# Altium footprint library Miscellaneous Devices LC.PcbLib: 776 footprints (part 5 of 49)
Each footprint in its own frame and in the unit in brackets; x right, y up, seen from the top. Pads: shape width x height; smd on the part's side, far side on the other; paste and mask are expansions set on the pad; w line width, h text height; cw(c..) or ccw(c..) is an arc to the next point about the centre after c.
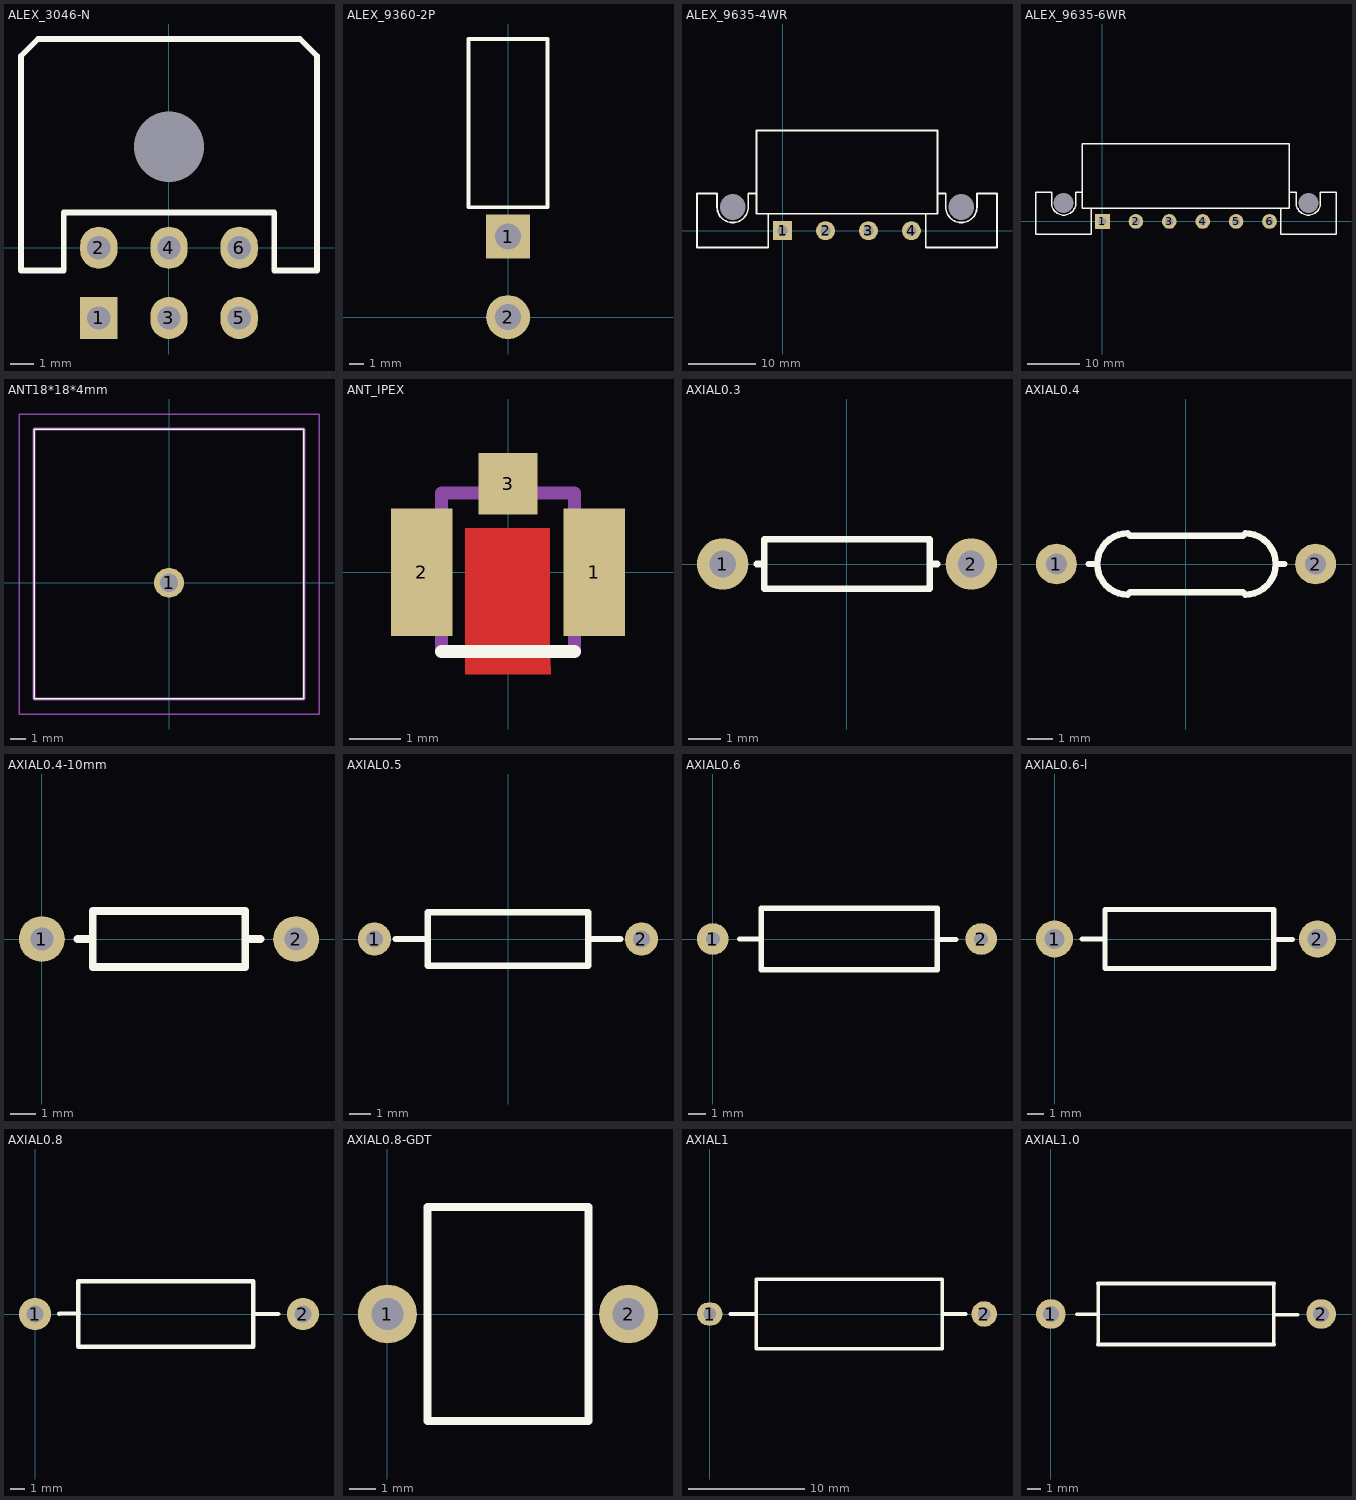
[diagram p4: the footprints below, top view; thin cyan lines are the x and y axes]

## ALEX_3046-N [mm] "配套3025-N"
pads (7):
  rect 1.6x1.8 hole 1: 1(-3,-3)
  oval 1.6x1.8 hole 1: 2(-3,0) 3(0,-3) 4(0,0) 5(3,-3) 6(3,0)
  round 0 hole 3 unplated: N/A(0,4.32)
Top Overlay:
  lines w0.254: -6.325,-0.975 -6.325,8.2 -5.6,8.925 5.6,8.925 6.325,8.2 6.325,-0.975 4.5,-0.975 4.5,1.5 -4.5,1.5 -4.5,-0.975 -6.325,-0.975

## ALEX_9360-2P [mm] "Mini Fit直角接头/ .165“（4.20mm）电源连接器"
pads (2):
  rect 3x3 hole 1.8: 1(0,5.5)
  round 3 hole 1.8: 2(0,0)
Top Overlay:
  lines w0.254: -2.704,7.5 -2.704,19 2.696,19 2.696,7.5 -2.704,7.5

## ALEX_9635-4WR [mm] "亚达康电源连接器"
height 9
pads (6):
  rect 2.8x2.8 hole 1.52: 1(0,0)
  round 2.8 hole 1.52: 2(6.35,0) 3(12.7,0) 4(19.05,0)
  round 0 hole 3.81 unplated: N/A(-7.37,3.5) N/A(26.42,3.5)
Top Overlay:
  lines w0.254: -3.835,5.5 -5.07,5.5 -5.07,3.5 cw(c-7.37,3.5) -9.67,3.5 -9.67,5.5 -12.64,5.5 -12.64,-2.47 -2.1,-2.47 -2.1,2.5 ; 21.15,2.5 21.15,-2.47 31.69,-2.47 31.69,5.5 28.72,5.5 28.72,3.5 cw(c26.42,3.5) 24.12,3.5 24.12,5.5 22.885,5.5 ; -3.835,2.5 -3.835,14.8 22.885,14.8 22.885,2.5 -3.835,2.5
3D body: height 8, standoff 0, extent -3.861,2.565 22.835,14.808

## ALEX_9635-6WR [mm] "亚达康电源连接器"
height 9
pads (8):
  rect 2.8x2.8 hole 1.52: 1(0,0)
  round 2.8 hole 1.52: 2(6.35,0) 3(12.7,0) 4(19.05,0) 5(25.4,0) 6(31.75,0)
  round 0 hole 3.81 unplated: N/A(-7.37,3.5) N/A(39.12,3.5)
Top Overlay:
  lines w0.254: -3.835,5.5 -5.07,5.5 -5.07,3.5 cw(c-7.37,3.5) -9.67,3.5 -9.67,5.5 -12.64,5.5 -12.64,-2.47 -2.1,-2.47 -2.1,2.5 ; 33.85,2.5 33.85,-2.47 44.39,-2.47 44.39,5.5 41.42,5.5 41.42,3.5 cw(c39.12,3.5) 36.82,3.5 36.82,5.5 35.585,5.5 ; -3.835,2.5 35.55,2.5 35.55,14.8 -3.835,14.8 -3.835,2.5
3D body: height 8, standoff 0, extent -3.861,2.565 35.475,14.808

## ANT18*18*4mm [mm] "GPS天线18*18*4mm"
height 4
pads (1):
  round 2 hole 1.2: 1(0,0)
Top Overlay:
  lines w0.1: -9,-7.75 9,-7.75 9,10.25 -9,10.25 -9,-7.75
Mechanical 15:
  lines w0.2: -9,-7.75 9,-7.75 9,10.25 -9,10.25 -9,-7.75
Mechanical 20:
  lines w0.1: -10,-8.75 10,-8.75 10,11.25 -10,11.25 -10,-8.75
3D body "CGGP.18.4.C.02.stp": height 4, standoff -5, extent -9,-7.75 9,10.25

## ANT_IPEX [mm]
pads (3):
  rect 1.2x2.5 smd: 1(1.685,0) 2(-1.685,0)
  rect 1.15x1.2 smd: 3(0,1.73)
Top Layer:
  pour cut-out: 0.82,-1.31 0.82,0.864 -0.834,0.864 -0.834,-1.997 0.835,-1.997 0.835,-2.005
Top Overlay:
  lines w0.254: -1.3,-1.55 1.3,-1.55
Mechanical 15:
  lines w0.254: -1.3,-1.55 -1.3,1.55 1.3,1.55 1.3,-1.55 -1.3,-1.55
3D body "U.FL-R-SMT-1.stp": height 1.25, standoff 0, extent -1.55,-1.4 1.45,1.7

## AXIAL0.3 [mil]
pads (2):
  round 62 hole 32: 1(-150,0) 2(150,0)
Top Overlay:
  lines w8: -109,0 -100,0 ; 109,0 100,0 ; 100,0 100,-30 -100,-30 -100,30 100,30 100,0
3D body "AXIAL0_3.STEP": height 86.32, standoff -31.5, extent -155,-45 155,40.63

## AXIAL0.4 [mm]
pads (2):
  round 1.6 hole 0.813: 1(-5.08,0) 2(5.08,0)
Top Overlay:
  lines w0.254: -3.81,0 -3.48,0 ; 3.52,0 3.861,0 ; -2.28,-1.2 cw(c-2.28,0) -2.28,1.2 -2.18,1.1 2.22,1.1 2.32,1.2 cw(c2.32,0) 2.32,-1.2 2.22,-1.1 -2.18,-1.1 -2.28,-1.2
3D body "AXIAL-0.4-0.25W.STEP": height 2.96, standoff -2.3, extent -5.334,-1.27 5.426,1.25

## AXIAL0.4-10mm [mm]
pads (2):
  round 1.8 hole 0.9: 1(0,0) 2(10,0)
Top Overlay:
  lines w0.305: 1.4,0 2,0 ; 8,0 8.6,0 ; 2,-1.1 8,-1.1 8,1.1 2,1.1 2,-1.1

## AXIAL0.5 [mil]
pads (2):
  round 62 hole 32: 1(-250,0) 2(250,0)
Top Overlay:
  lines w12: -210,0 -150,0 ; 150,0 210,0 ; -150,-50 150,-50 150,50 -150,50 -150,-50
3D body "AXIAL0_5.STEP": height 119.08, standoff -59.06, extent -255,-55 255,51.27

## AXIAL0.6 [mm]
pads (2):
  round 1.8 hole 0.8: 1(0,0) 2(15.24,0)
Top Overlay:
  lines w0.305: 1.524,0 2.531,0 ; 12.802,-0.025 13.792,-0.025 ; 2.746,-1.75 2.746,1.75 12.746,1.75 12.746,-1.75 2.746,-1.75

## AXIAL0.6-l [mm]
pads (2):
  round 2.2 hole 1.2: 1(0,0) 2(15.595,0)
Top Overlay:
  lines w0.305: 1.626,0 2.785,0 ; 13.056,-0.025 14.097,-0.025 ; 3,-1.75 13,-1.75 13,1.75 3,1.75 3,-1.75

## AXIAL0.8 [mm]
pads (2):
  round 2.2 hole 1.2: 1(0,0) 2(18.415,0)
Top Overlay:
  lines w0.305: 1.651,0.031 2.997,0.051 ; 14.986,0 16.713,0 ; 2.984,-2.25 14.984,-2.25 14.984,2.25 2.984,2.25 2.984,-2.25

## AXIAL0.8-GDT [mm]
pads (2):
  round 2.2 hole 1.2: 1(0,0) 2(9,0)
Top Overlay:
  lines w0.305: 1.5,-4 7.5,-4 7.5,4 1.5,4 1.5,-4

## AXIAL1 [mm]
pads (2):
  oval 2.2x2 hole 1.1: 1(0,0)
  round 2.2 hole 1.1: 2(23.622,0)
Top Overlay:
  lines w0.305: 1.75,0 3.81,0 ; 20.066,0 22.047,0 ; 4,-3 20,-3 20,3 4,3 4,-3

## AXIAL1.0 [mm]
height 10
pads (2):
  round 2.2 hole 1.2: 1(0,0) 2(20,0)
Top Overlay:
  lines w0.254: 1.905,-0.025 3.5,-0.025 ; 3.5,-2.25 3.5,2.25 ; 16.5,-2.25 16.5,2.25 ; 16.5,-0.05 18.275,-0.05
  lines w0.305: 3.5,-2.25 16.5,-2.25 ; 3.5,2.25 16.5,2.25